# Altium footprint library FULL_CB_REV_D.PcbLib: 35 footprints (part 1 of 3)
Each footprint in its own frame and in the unit in brackets; x right, y up, seen from the top. Pads: shape width x height; smd on the part's side, far side on the other; paste and mask are expansions set on the pad; w line width, h text height; cw(c..) or ccw(c..) is an arc to the next point about the centre after c.
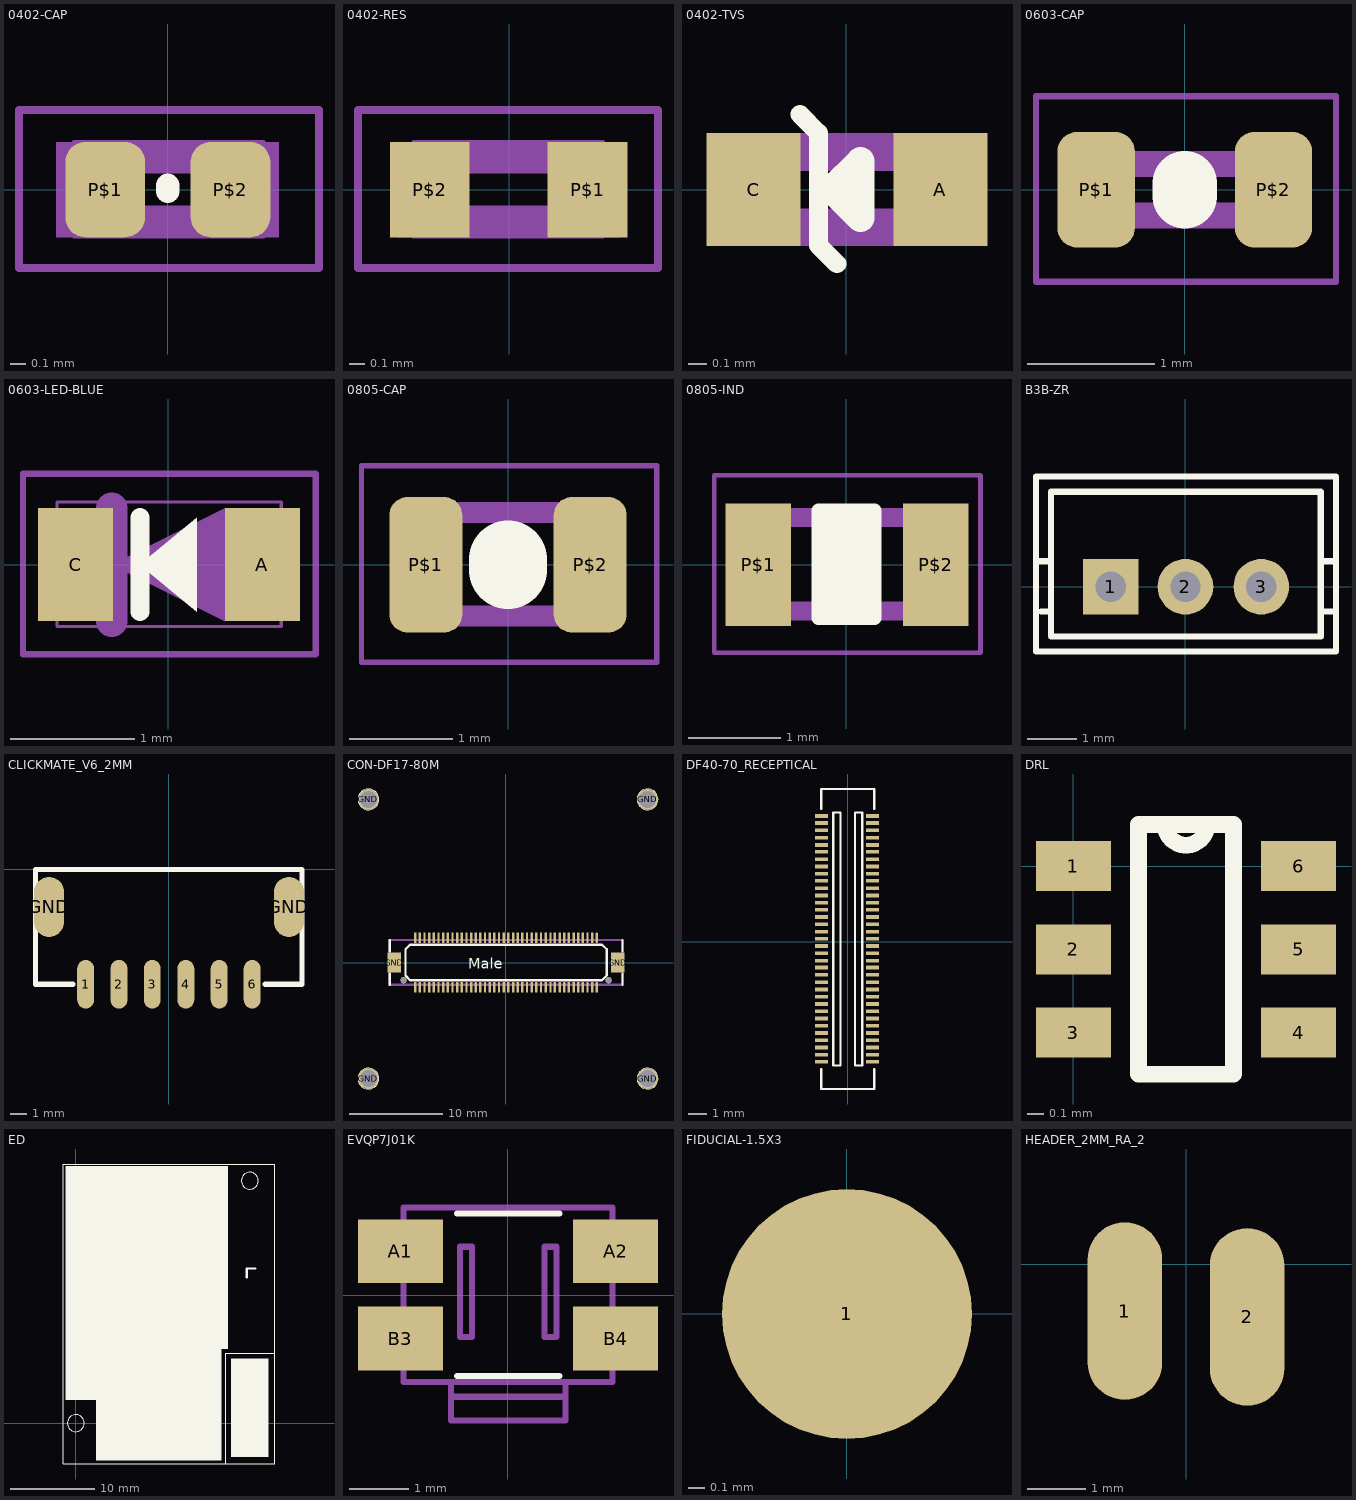
[diagram p0: the footprints below, top view; thin cyan lines are the x and y axes]

## 0402-CAP [mil]
pads (2):
  rrect50% 20x24 smd mask+0: P$1(-15.75,0) P$2(15.75,0)
Top Overlay:
  lines w6: 0,-0.39 0,1
Mechanical 16:
  rectangle: -28.04,-12 -16.04,12
  rectangle: 15.96,-12 27.96,12
  lines w1: -23.62,-11.81 24,-11.81 24,12 -23.62,12 -23.62,-11.81
  lines w2: -37.4,-19.68 38,-19.68 38,20 -37.4,20 -37.4,-19.68
  lines w8: -20,-8 20,-8 ; -20,8 20,8
3D body "cap_0402.STEP": height 19.68, standoff 0, extent -19.69,-9.84 19.69,9.84

## 0402-RES [mil] "0402-RES"
pads (2):
  rect 20x24 smd: P$1(19.68,0) P$2(-20,0)
Bottom Overlay:
  region: 3,12 -3,12 -3,-11.81 3,-11.81
Mechanical 16:
  region: 28,12 16,12 16,-12 28,-12
  region: -16,12 -28,12 -28,-12 -16,-12
  lines w1: -24,-11.81 -24,12 23.62,12 23.62,-11.81 -24,-11.81
  lines w2: -38,-19.68 -38,20 37.4,20 37.4,-19.68 -38,-19.68
  lines w8: -20,-8 20,-8 ; -20,8 20,8
3D body "res_0402.STEP": height 19.68, standoff 0, extent -19.68,-9.84 19.68,9.84

## 0402-TVS [mil] "0402-TVS"
pads (2):
  rect 20x24 smd: A(20,0) C(-19.68,0)
Top Overlay:
  lines w4: -9.84,16 -5.91,12 -5.91,-11.81 -1.97,-15.75
  lines w6: -3,0 3,6 3,0 ; -3,0 3,-6 3,0 ; -3,0 3,0
Mechanical 16:
  rectangle: -28,-12 -16,12
  rectangle: 16,-12 28,12
  lines w8: -20,-8 20,-8 ; -20,8 20,8
3D body "res_0402.STEP": height 19.68, standoff 0, extent -19.69,-9.84 19.68,9.84

## 0603-CAP [mil] "0603-CAP"
pads (2):
  rrect50% 24x36 smd mask+0: P$1(-27.56,0) P$2(27.56,0)
Top Overlay:
  lines w20: 0,-2 0,2
Mechanical 16:
  rectangle: -28,-12 -16,12
  rectangle: 16,-12 28,12
  lines w2: -46.26,-28.54 47,-28.54 47,29 -46.26,29 -46.26,-28.54
  lines w8: -20,-8 20,-8 ; -20,8 20,8
3D body "cap_0603.STEP": height 34.25, standoff -0.39, extent -31.5,-15.95 31.5,15.94

## 0603-LED-BLUE [mil] "0603-LED_Blue"
pads (2):
  rect 24x36 smd: A(30,0) C(-29.53,0)
Top Overlay:
  region: -9,0 9,15 9,-15
  lines w6: -9,-15 -9,15
Mechanical 16:
  region: -18,0 18,18 18,-18
  lines w1: -35.43,-19.68 36,-19.68 36,20 -35.43,20 -35.43,-19.68
  lines w2: -46.26,-28.54 47,-28.54 47,29 -46.26,29 -46.26,-28.54
  lines w10: -18,-18 -18,18
3D body "0603-LED-Blue.STEP": height 35.43, standoff 0, extent -33.46,-17.72 33.47,17.72

## 0805-CAP [mil]
pads (2):
  rrect50% 28x52 smd mask+0: P$1(-31.5,0) P$2(31.5,0)
Top Overlay:
  lines w30: 0,-2 0,2
Mechanical 16:
  rectangle: 24,-23.67 40,24
  rectangle: -39.37,-23.67 -23.62,24
  lines w2: -56.1,-37.4 -56.1,38 57,38 57,-37.4 -56.1,-37.4
  lines w8: -23.62,-19.68 24,-19.68 ; -23.62,20 24,20
3D body "cap_0805.STEP": height 30.79, standoff 0, extent -39.37,-24.61 39.37,24.61

## 0805-IND [mil]
pads (2):
  rect 28x52 smd: P$1(-37.4,0) P$2(38,0)
Top Overlay:
  rectangle: -11.76,-22.59 12,23
  lines w6: -11.76,-22.59 12,-22.59 12,23 -11.76,23 -11.76,-22.59
Mechanical 16:
  rectangle: 24,-23.67 40,24
  rectangle: -39.37,-23.67 -23.62,24
  lines w2: -56.1,-37.4 -56.1,38 57,38 57,-37.4 -56.1,-37.4
  lines w8: -23.62,-19.68 24,-19.68 ; -23.62,20 24,20

## B3B-ZR [mil]
pads (3):
  rect 44x44 hole 24: 1(-59.06,0)
  round 44 hole 24: 2(0,0) 3(60,0)
Top Overlay:
  lines w5: -114.17,-19.68 -106.3,-19.68 ; -118.11,20 -118.11,-51.18 119,-51.18 119,-19.68 ; -118.11,20 -118.11,87 119,87 119,20 ; -118.11,20 -106.3,20 ; -106.3,-19.68 -106.3,20 ; -106.3,-19.68 -106.3,-39.37 107,-39.37 107,-19.68 ; -106.3,20 -106.3,75 107,75 107,20 ; 107,-19.68 119,-19.68 ; 107,-19.68 107,20 ; 107,20 119,20 ; 119,-19.68 119,20
Mechanical 16:
  lines w1: -118.11,-51.18 119,-51.18 119,87 -118.11,87 -118.11,-51.18

## CLICKMATE_V6_2MM [mil]
pads (8):
  rrect100% 40x115 smd: 1(-196.85,-271.65) 2(-118.11,-271.65) 3(-39.37,-271.65) 4(40,-271.65) 5(119,-271.65) 6(197,-271.65)
  rrect100% 71x142 smd: GND(-283.46,-88.58) GND(284,-88.58)
Top Overlay:
  lines w12: -226.38,-271.65 -314.96,-271.65 -314.96,0 315,0 315,-271.65 227,-271.65
  text "." at -225,-285 h155
3D body "5024430670.stp": height 294.65, standoff -0.62, extent -314.96,-303.31 314.96,-0.16

## CON-DF17-80M [mil]
pads (88):
  rrect100% 10x44 smd: 1(384,105)
  rect 10x44 smd: 2(384,-104.33) 3(365,105) 4(365,-104.33) 5(345,105) 6(345,-104.33) 7(325,105) 8(325,-104.33) 9(306,105) 10(306,-104.33) 11(286,105) 12(286,-104.33) 13(266,105) 14(266,-104.33) 15(247,105) 16(247,-104.33) 17(227,105) 18(227,-104.33) 19(207,105) 20(207,-104.33) 21(188,105) 22(188,-104.33) 23(168,105) 24(168,-104.33) 25(148,105) 26(148,-104.33) 27(128,105) 28(128,-104.33) 29(109,105) 30(109,-104.33) 31(89,105) 32(89,-104.33) 33(69,105) 34(69,-104.33) 35(50,105) 36(50,-104.33) 37(30,105) 38(30,-104.33) 39(10,105) 40(10,-104.33) 41(-9.84,105) 42(-9.84,-104.33) 43(-29.53,105) 44(-29.53,-104.33) 45(-49.21,105) 46(-49.21,-104.33) 47(-68.9,105) 48(-68.9,-104.33) 49(-88.58,105) 50(-88.58,-104.33) 51(-108.27,105) 52(-108.27,-104.33) 53(-127.95,105) 54(-127.95,-104.33) 55(-147.64,105) 56(-147.64,-104.33) 57(-167.32,105) 58(-167.32,-104.33) 59(-187.01,105) 60(-187.01,-104.33) 61(-206.69,105) 62(-206.69,-104.33) 63(-226.38,105) 64(-226.38,-104.33) 65(-246.06,105) 66(-246.06,-104.33) 67(-265.75,105) 68(-265.75,-104.33) 69(-285.43,105) 70(-285.43,-104.33) 71(-305.12,105) 72(-305.12,-104.33) 73(-324.8,105) 74(-324.8,-104.33) 75(-344.49,105) 76(-344.49,-104.33) 77(-364.17,105) 78(-364.17,-104.33) 79(-383.86,105) 80(-383.86,-104.33)
  round 87 hole 71: GND(-582,-491) GND(-582,690) GND(599,-491) GND(599,690)
  rect 56x83 smd: GND(-472.44,0) GND(473,0)
  round 26 hole 26 unplated: hole-1(-433.07,-74.8) hole-2(434,-74.8)
Top Overlay:
  circle w5: c-582,-491 r44
  circle w5: c599,-491 r44
  circle w5: c-582,690 r44
  circle w5: c599,690 r44
  lines w10: -492.13,-94.49 -492.13,-47.24 ; -492.13,48 -492.13,95 ; 493,-94.49 493,-47.24 ; 493,48 493,95 ; -425.2,-55.12 -425.2,56 -405.51,75 406,75 426,56 426,-55.12 406,-74.8 -405.51,-74.8 -425.2,-55.12
  text "Male" at -159.84,-40.16 h77.5
Bottom Overlay:
  circle w5: c-582,-491 r44
  circle w5: c-582,-491 r44
  circle w5: c599,-491 r44
  circle w5: c599,-491 r44
  circle w5: c-582,690 r44
  circle w5: c-582,690 r44
  circle w5: c599,690 r44
  circle w5: c599,690 r44
Mechanical 16:
  lines w10: -492.13,-94.49 493,-94.49 493,95 -492.13,95 -492.13,-94.49
3D body "DF17(1_0H)-80DP-0_5V.stp": height 123.54, standoff -30.01, extent -492.13,-109.41 492.13,115

## DF40-70_RECEPTICAL [mil]
pads (70):
  rect 28x8 smd: 1(-57.09,273.5) 2(54,273.5) 3(-57.09,258.5) 4(54,258.5) 5(-57.09,242.5) 6(54,242.5) 7(-57.09,226.5) 8(54,226.5) 9(-57.09,210.5) 10(54,210.5) 11(-57.09,195.5) 12(54,195.5) 13(-57.09,179.5) 14(54,179.5) 15(-57.09,163.5) 16(54,163.5) 17(-57.09,147.5) 18(54,147.5) 19(-57.09,132.5) 20(54,132.5) 21(-57.09,116.5) 22(54,116.5) 23(-57.09,100.5) 24(54,100.5) 25(-57.09,84.5) 26(54,84.5) 27(-57.09,69.5) 28(54,69.5) 29(-57.09,53.5) 30(54,53.5) 31(-57.09,37.5) 32(54,37.5) 33(-57.09,21.5) 34(54,21.5) 35(-57.09,6.5) 36(54,6.5) 37(-57.09,-9.5) 38(54,-9.5) 39(-57.09,-25.5) 40(54,-25.5) 41(-57.09,-41.5) 42(54,-41.5) 43(-57.09,-56.5) 44(54,-56.5) 45(-57.09,-72.5) 46(54,-72.5) 47(-57.09,-88.5) 48(54,-88.5) 49(-57.09,-104.5) 50(54,-104.5) 51(-57.09,-120.37) 52(54,-120.37) 53(-57.09,-136.12) 54(54,-136.12) 55(-57.09,-151.87) 56(54,-151.87) 57(-57.09,-167.62) 58(54,-167.62) 59(-57.09,-183.37) 60(54,-183.37) 61(-57.09,-199.11) 62(54,-199.11) 63(-57.09,-214.86) 64(54,-214.86) 65(-57.09,-230.61) 66(54,-230.61) 67(-57.09,-246.36) 68(54,-246.36) 69(-57.09,-262.11) 70(54,-262.11)
Top Overlay:
  lines w5: -57.87,-277.85 -57.87,-321.16 58,-321.16 58,-277.85 ; -57.87,289.5 -57.87,332.5 58,332.5 58,289.5 ; -31.5,-270 -31.5,281.5 -15.75,281.5 -15.75,-270 -31.5,-269.98 ; 16,-270 16,281.5 32,281.5 32,-269.98 16,-269.98
3D body "DF40C(2.0)-70DS.stp": height 75.12, standoff -1.65, extent -67.5,-321.77 65.57,331.77

## DRL [mm]
pads (6):
  rect 0.45x0.3 smd: 1(0,0) 2(0,-0.5) 3(0,-1) 4(1.35,-1) 5(1.35,-0.5) 6(1.35,0)
Top Overlay:
  lines w0.1: 0.39,-1.25 0.96,-1.25 0.96,0.25 0.55,0.25 ccw(c0.675,0.25) 0.8,0.25 0.39,0.25 0.39,-1.25
3D body: height 0.6, standoff -0.05, extent 0.4,-1.2 1,0.2

## ED [mil]
Top Overlay:
  circle w3.94: c811.02,1129.53 r39.37
  circle w3.94: c0,0 r39.37
  region: -47.24,1196.85 -47.24,110.24 94.49,110.24 94.49,-173.23 677.17,-173.23 677.17,346.46 708.66,346.46 708.66,1196.85
  region: 724.41,299.21 897.64,299.21 897.64,-157.48 724.41,-157.48
  lines w3.94: 698.82,-190.16 698.82,325.98 922.36,325.98 ; -57.87,-190.16 926.38,-190.16 926.38,1207.48 -57.87,1207.48 -57.87,-190.16
  lines w10: 796.46,678.54 796.46,720.47 835.83,720.47

## EVQP7J01K [mil]
pads (4):
  rect 56x42 smd: A1(-70.87,29) A2(71,29) B3(-70.87,-28.54) B4(71,-28.54)
Top Overlay:
  lines w4: -82.68,20 -82.68,24 ; -33.46,-53.15 34,-53.15 ; -33.46,54 34,54
Mechanical 16:
  lines w4: -82.68,20 -70.87,20 ; -82.68,24 -90.55,24 -90.55,40 -70.87,40 ; -70.87,-39.37 -90.55,-39.37 -90.55,-23.62 -82.68,-23.62 -82.68,-19.68 -70.87,-19.68 ; 38,-66.93 -37.4,-66.93 ; 71,-39.37 91,-39.37 91,-23.62 83,-23.62 83,-19.68 71,-19.68 ; 71,20 83,20 83,24 91,24 91,40 71,40 ; -37.4,-66.93 -37.4,-82.68 38,-82.68 38,-57.09 ; -37.4,-66.93 -37.4,-57.09 ; -37.4,-57.09 -68.9,-57.09 -68.9,58 69,58 69,-57.09 38,-57.09 ; -37.4,-57.09 38,-57.09 ; -31.5,-27.56 -31.5,32 -23.62,32 -23.62,-27.56 -31.5,-27.56 ; 24,-27.56 24,32 32,32 32,-27.56 24,-27.56
3D body "EVQP7-JA-01P.STEP": height -62.99, standoff -116.14, extent -92.52,-82.68 92.52,57.09

## FIDUCIAL-1.5X3 [mil]
pads (1):
  rrect100% 60x60 smd paste-78.74: 1(0,0)
Top Solder:
  circle w50: c0,0 r36

## HEADER_2MM_RA_2 [mil]
pads (2):
  rrect100% 50x119 smd: 1(-41.19,-31.46) 2(40.8,-35.39)